# Altium footprint library texas.PCBLIB: 124 footprints (part 9 of 12) (continued)
## RFP_S-PQFP-G144-EXPAD [mm] (continued)
Top Paste:
  rectangle: -11.45,8.625 -9.95,8.875
  rectangle: -11.45,8.125 -9.95,8.375
  rectangle: -11.45,7.625 -9.95,7.875
  rectangle: -11.45,7.125 -9.95,7.375
  rectangle: -11.45,6.625 -9.95,6.875
  rectangle: -11.45,6.125 -9.95,6.375
  rectangle: -11.45,5.625 -9.95,5.875
  rectangle: -11.45,5.125 -9.95,5.375
  rectangle: -11.45,4.625 -9.95,4.875
  rectangle: -11.45,4.125 -9.95,4.375
  rectangle: -11.45,3.625 -9.95,3.875
  rectangle: -11.45,3.125 -9.95,3.375
  rectangle: -11.45,2.625 -9.95,2.875
  rectangle: -11.45,2.125 -9.95,2.375
  rectangle: -11.45,1.625 -9.95,1.875
  rectangle: -11.45,1.125 -9.95,1.375
  rectangle: -11.45,0.625 -9.95,0.875
  rectangle: -11.45,0.125 -9.95,0.375
  rectangle: -11.45,-0.375 -9.95,-0.125
  rectangle: -11.45,-0.875 -9.95,-0.625
  rectangle: -11.45,-1.375 -9.95,-1.125
  rectangle: -11.45,-1.875 -9.95,-1.625
  rectangle: -11.45,-2.375 -9.95,-2.125
  rectangle: -11.45,-2.875 -9.95,-2.625
  rectangle: -11.45,-3.375 -9.95,-3.125
  rectangle: -11.45,-3.875 -9.95,-3.625
  rectangle: -11.45,-4.375 -9.95,-4.125
  rectangle: -11.45,-4.875 -9.95,-4.625
  rectangle: -11.45,-5.375 -9.95,-5.125
  rectangle: -11.45,-5.875 -9.95,-5.625
  rectangle: -11.45,-6.375 -9.95,-6.125
  rectangle: -11.45,-6.875 -9.95,-6.625
  rectangle: -11.45,-7.375 -9.95,-7.125
  rectangle: -11.45,-7.875 -9.95,-7.625
  rectangle: -11.45,-8.375 -9.95,-8.125
  rectangle: -11.45,-8.875 -9.95,-8.625
  region: -8.625,-11.45 -8.625,-9.95 -8.875,-9.95 -8.875,-11.45
  region: -8.125,-11.45 -8.125,-9.95 -8.375,-9.95 -8.375,-11.45
  region: -7.625,-11.45 -7.625,-9.95 -7.875,-9.95 -7.875,-11.45
  region: -7.125,-11.45 -7.125,-9.95 -7.375,-9.95 -7.375,-11.45
  region: -6.625,-11.45 -6.625,-9.95 -6.875,-9.95 -6.875,-11.45
  region: -6.125,-11.45 -6.125,-9.95 -6.375,-9.95 -6.375,-11.45
  region: -5.625,-11.45 -5.625,-9.95 -5.875,-9.95 -5.875,-11.45
  region: -5.125,-11.45 -5.125,-9.95 -5.375,-9.95 -5.375,-11.45
  region: -4.625,-11.45 -4.625,-9.95 -4.875,-9.95 -4.875,-11.45
  region: -4.125,-11.45 -4.125,-9.95 -4.375,-9.95 -4.375,-11.45
  region: -3.625,-11.45 -3.625,-9.95 -3.875,-9.95 -3.875,-11.45
  region: -3.125,-11.45 -3.125,-9.95 -3.375,-9.95 -3.375,-11.45
  region: -2.625,-11.45 -2.625,-9.95 -2.875,-9.95 -2.875,-11.45
  region: -2.125,-11.45 -2.125,-9.95 -2.375,-9.95 -2.375,-11.45
  region: -1.625,-11.45 -1.625,-9.95 -1.875,-9.95 -1.875,-11.45
  region: -1.125,-11.45 -1.125,-9.95 -1.375,-9.95 -1.375,-11.45
  region: -0.625,-11.45 -0.625,-9.95 -0.875,-9.95 -0.875,-11.45
  region: -0.125,-11.45 -0.125,-9.95 -0.375,-9.95 -0.375,-11.45
  region: 0.375,-11.45 0.375,-9.95 0.125,-9.95 0.125,-11.45
  region: 0.875,-11.45 0.875,-9.95 0.625,-9.95 0.625,-11.45
  region: 1.375,-11.45 1.375,-9.95 1.125,-9.95 1.125,-11.45
  region: 1.875,-11.45 1.875,-9.95 1.625,-9.95 1.625,-11.45
  region: 2.375,-11.45 2.375,-9.95 2.125,-9.95 2.125,-11.45
  region: 2.875,-11.45 2.875,-9.95 2.625,-9.95 2.625,-11.45
  region: 3.375,-11.45 3.375,-9.95 3.125,-9.95 3.125,-11.45
  region: 3.875,-11.45 3.875,-9.95 3.625,-9.95 3.625,-11.45
  region: 4.375,-11.45 4.375,-9.95 4.125,-9.95 4.125,-11.45
  region: 4.875,-11.45 4.875,-9.95 4.625,-9.95 4.625,-11.45
  region: 5.375,-11.45 5.375,-9.95 5.125,-9.95 5.125,-11.45
  region: 5.875,-11.45 5.875,-9.95 5.625,-9.95 5.625,-11.45
  region: 6.375,-11.45 6.375,-9.95 6.125,-9.95 6.125,-11.45
  region: 6.875,-11.45 6.875,-9.95 6.625,-9.95 6.625,-11.45
  region: 7.375,-11.45 7.375,-9.95 7.125,-9.95 7.125,-11.45
  region: 7.875,-11.45 7.875,-9.95 7.625,-9.95 7.625,-11.45
  region: 8.375,-11.45 8.375,-9.95 8.125,-9.95 8.125,-11.45
  region: 8.875,-11.45 8.875,-9.95 8.625,-9.95 8.625,-11.45
  region: 11.45,-8.625 9.95,-8.625 9.95,-8.875 11.45,-8.875
  region: 11.45,-8.125 9.95,-8.125 9.95,-8.375 11.45,-8.375
  region: 11.45,-7.625 9.95,-7.625 9.95,-7.875 11.45,-7.875
  region: 11.45,-7.125 9.95,-7.125 9.95,-7.375 11.45,-7.375
  region: 11.45,-6.625 9.95,-6.625 9.95,-6.875 11.45,-6.875
  region: 11.45,-6.125 9.95,-6.125 9.95,-6.375 11.45,-6.375
  region: 11.45,-5.625 9.95,-5.625 9.95,-5.875 11.45,-5.875
  region: 11.45,-5.125 9.95,-5.125 9.95,-5.375 11.45,-5.375
  region: 11.45,-4.625 9.95,-4.625 9.95,-4.875 11.45,-4.875
  region: 11.45,-4.125 9.95,-4.125 9.95,-4.375 11.45,-4.375
  region: 11.45,-3.625 9.95,-3.625 9.95,-3.875 11.45,-3.875
  region: 11.45,-3.125 9.95,-3.125 9.95,-3.375 11.45,-3.375
  region: 11.45,-2.625 9.95,-2.625 9.95,-2.875 11.45,-2.875
  region: 11.45,-2.125 9.95,-2.125 9.95,-2.375 11.45,-2.375
  region: 11.45,-1.625 9.95,-1.625 9.95,-1.875 11.45,-1.875
  region: 11.45,-1.125 9.95,-1.125 9.95,-1.375 11.45,-1.375
  region: 11.45,-0.625 9.95,-0.625 9.95,-0.875 11.45,-0.875
  region: 11.45,-0.125 9.95,-0.125 9.95,-0.375 11.45,-0.375
  region: 11.45,0.375 9.95,0.375 9.95,0.125 11.45,0.125
  region: 11.45,0.875 9.95,0.875 9.95,0.625 11.45,0.625
  region: 11.45,1.375 9.95,1.375 9.95,1.125 11.45,1.125
  region: 11.45,1.875 9.95,1.875 9.95,1.625 11.45,1.625
  region: 11.45,2.375 9.95,2.375 9.95,2.125 11.45,2.125
  region: 11.45,2.875 9.95,2.875 9.95,2.625 11.45,2.625
  region: 11.45,3.375 9.95,3.375 9.95,3.125 11.45,3.125
  region: 11.45,3.875 9.95,3.875 9.95,3.625 11.45,3.625
  region: 11.45,4.375 9.95,4.375 9.95,4.125 11.45,4.125
  region: 11.45,4.875 9.95,4.875 9.95,4.625 11.45,4.625
  region: 11.45,5.375 9.95,5.375 9.95,5.125 11.45,5.125
  region: 11.45,5.875 9.95,5.875 9.95,5.625 11.45,5.625
  region: 11.45,6.375 9.95,6.375 9.95,6.125 11.45,6.125
  region: 11.45,6.875 9.95,6.875 9.95,6.625 11.45,6.625
  region: 11.45,7.375 9.95,7.375 9.95,7.125 11.45,7.125
  region: 11.45,7.875 9.95,7.875 9.95,7.625 11.45,7.625
  region: 11.45,8.375 9.95,8.375 9.95,8.125 11.45,8.125
  region: 11.45,8.875 9.95,8.875 9.95,8.625 11.45,8.625
  region: 8.625,11.45 8.625,9.95 8.875,9.95 8.875,11.45
  region: 8.125,11.45 8.125,9.95 8.375,9.95 8.375,11.45
  region: 7.625,11.45 7.625,9.95 7.875,9.95 7.875,11.45
  region: 7.125,11.45 7.125,9.95 7.375,9.95 7.375,11.45
  region: 6.625,11.45 6.625,9.95 6.875,9.95 6.875,11.45
  region: 6.125,11.45 6.125,9.95 6.375,9.95 6.375,11.45
  region: 5.625,11.45 5.625,9.95 5.875,9.95 5.875,11.45
  region: 5.125,11.45 5.125,9.95 5.375,9.95 5.375,11.45
  region: 4.625,11.45 4.625,9.95 4.875,9.95 4.875,11.45
  region: 4.125,11.45 4.125,9.95 4.375,9.95 4.375,11.45
  region: 3.625,11.45 3.625,9.95 3.875,9.95 3.875,11.45
  region: 3.125,11.45 3.125,9.95 3.375,9.95 3.375,11.45
  region: 2.625,11.45 2.625,9.95 2.875,9.95 2.875,11.45
  region: 2.125,11.45 2.125,9.95 2.375,9.95 2.375,11.45
  region: 1.625,11.45 1.625,9.95 1.875,9.95 1.875,11.45
  region: 1.125,11.45 1.125,9.95 1.375,9.95 1.375,11.45
  region: 0.625,11.45 0.625,9.95 0.875,9.95 0.875,11.45
  region: 0.125,11.45 0.125,9.95 0.375,9.95 0.375,11.45
  region: -0.375,11.45 -0.375,9.95 -0.125,9.95 -0.125,11.45
  region: -0.875,11.45 -0.875,9.95 -0.625,9.95 -0.625,11.45
  region: -1.375,11.45 -1.375,9.95 -1.125,9.95 -1.125,11.45
  region: -1.875,11.45 -1.875,9.95 -1.625,9.95 -1.625,11.45
  region: -2.375,11.45 -2.375,9.95 -2.125,9.95 -2.125,11.45
  region: -2.875,11.45 -2.875,9.95 -2.625,9.95 -2.625,11.45
  region: -3.375,11.45 -3.375,9.95 -3.125,9.95 -3.125,11.45
  region: -3.875,11.45 -3.875,9.95 -3.625,9.95 -3.625,11.45
  region: -4.375,11.45 -4.375,9.95 -4.125,9.95 -4.125,11.45
  region: -4.875,11.45 -4.875,9.95 -4.625,9.95 -4.625,11.45
  region: -5.375,11.45 -5.375,9.95 -5.125,9.95 -5.125,11.45
  region: -5.875,11.45 -5.875,9.95 -5.625,9.95 -5.625,11.45
  region: -6.375,11.45 -6.375,9.95 -6.125,9.95 -6.125,11.45
  region: -6.875,11.45 -6.875,9.95 -6.625,9.95 -6.625,11.45
  region: -7.375,11.45 -7.375,9.95 -7.125,9.95 -7.125,11.45
  region: -7.875,11.45 -7.875,9.95 -7.625,9.95 -7.625,11.45
  region: -8.375,11.45 -8.375,9.95 -8.125,9.95 -8.125,11.45
  region: -8.875,11.45 -8.875,9.95 -8.625,9.95 -8.625,11.45
  rectangle: -2.75,-2.75 2.75,2.775
Top Solder:
  rectangle: -11.55,8.575 -9.875,8.925
  rectangle: -11.55,8.075 -9.875,8.425
  rectangle: -11.55,7.575 -9.875,7.925
  rectangle: -11.55,7.075 -9.875,7.425
  rectangle: -11.55,6.575 -9.875,6.925
  rectangle: -11.55,6.075 -9.875,6.425
  rectangle: -11.55,5.575 -9.875,5.925
  rectangle: -11.55,5.075 -9.875,5.425
  rectangle: -11.55,4.575 -9.875,4.925
  rectangle: -11.55,4.075 -9.875,4.425
  rectangle: -11.55,3.575 -9.875,3.925
  rectangle: -11.55,3.075 -9.875,3.425
  rectangle: -11.55,2.575 -9.875,2.925
  rectangle: -11.55,2.075 -9.875,2.425
  rectangle: -11.55,1.575 -9.875,1.925
  rectangle: -11.55,1.075 -9.875,1.425
  rectangle: -11.55,0.575 -9.875,0.925
  rectangle: -11.55,0.075 -9.875,0.425
  rectangle: -11.55,-0.425 -9.875,-0.075
  rectangle: -11.55,-0.925 -9.875,-0.575
  rectangle: -11.55,-1.425 -9.875,-1.075
  rectangle: -11.55,-1.925 -9.875,-1.575
  rectangle: -11.55,-2.425 -9.875,-2.075
  rectangle: -11.55,-2.925 -9.875,-2.575
  rectangle: -11.55,-3.425 -9.875,-3.075
  rectangle: -11.55,-3.925 -9.875,-3.575
  rectangle: -11.55,-4.425 -9.875,-4.075
  rectangle: -11.55,-4.925 -9.875,-4.575
  rectangle: -11.55,-5.425 -9.875,-5.075
  rectangle: -11.55,-5.925 -9.875,-5.575
  rectangle: -11.55,-6.425 -9.875,-6.075
  rectangle: -11.55,-6.925 -9.875,-6.575
  rectangle: -11.55,-7.425 -9.875,-7.075
  rectangle: -11.55,-7.925 -9.875,-7.575
  rectangle: -11.55,-8.425 -9.875,-8.075
  rectangle: -11.55,-8.925 -9.875,-8.575
  region: -8.575,-11.55 -8.575,-9.875 -8.925,-9.875 -8.925,-11.55
  region: -8.075,-11.55 -8.075,-9.875 -8.425,-9.875 -8.425,-11.55
  region: -7.575,-11.55 -7.575,-9.875 -7.925,-9.875 -7.925,-11.55
  region: -7.075,-11.55 -7.075,-9.875 -7.425,-9.875 -7.425,-11.55
  region: -6.575,-11.55 -6.575,-9.875 -6.925,-9.875 -6.925,-11.55
  region: -6.075,-11.55 -6.075,-9.875 -6.425,-9.875 -6.425,-11.55
  region: -5.575,-11.55 -5.575,-9.875 -5.925,-9.875 -5.925,-11.55
  region: -5.075,-11.55 -5.075,-9.875 -5.425,-9.875 -5.425,-11.55
  region: -4.575,-11.55 -4.575,-9.875 -4.925,-9.875 -4.925,-11.55
  region: -4.075,-11.55 -4.075,-9.875 -4.425,-9.875 -4.425,-11.55
  region: -3.575,-11.55 -3.575,-9.875 -3.925,-9.875 -3.925,-11.55
  region: -3.075,-11.55 -3.075,-9.875 -3.425,-9.875 -3.425,-11.55
  region: -2.575,-11.55 -2.575,-9.875 -2.925,-9.875 -2.925,-11.55
  region: -2.075,-11.55 -2.075,-9.875 -2.425,-9.875 -2.425,-11.55
  region: -1.575,-11.55 -1.575,-9.875 -1.925,-9.875 -1.925,-11.55
  region: -1.075,-11.55 -1.075,-9.875 -1.425,-9.875 -1.425,-11.55
  region: -0.575,-11.55 -0.575,-9.875 -0.925,-9.875 -0.925,-11.55
  region: -0.075,-11.55 -0.075,-9.875 -0.425,-9.875 -0.425,-11.55
  region: 0.425,-11.55 0.425,-9.875 0.075,-9.875 0.075,-11.55
  region: 0.925,-11.55 0.925,-9.875 0.575,-9.875 0.575,-11.55
  region: 1.425,-11.55 1.425,-9.875 1.075,-9.875 1.075,-11.55
  region: 1.925,-11.55 1.925,-9.875 1.575,-9.875 1.575,-11.55
  region: 2.425,-11.55 2.425,-9.875 2.075,-9.875 2.075,-11.55
  region: 2.925,-11.55 2.925,-9.875 2.575,-9.875 2.575,-11.55
  region: 3.425,-11.55 3.425,-9.875 3.075,-9.875 3.075,-11.55
  region: 3.925,-11.55 3.925,-9.875 3.575,-9.875 3.575,-11.55
  region: 4.425,-11.55 4.425,-9.875 4.075,-9.875 4.075,-11.55
  region: 4.925,-11.55 4.925,-9.875 4.575,-9.875 4.575,-11.55
  region: 5.425,-11.55 5.425,-9.875 5.075,-9.875 5.075,-11.55
  region: 5.925,-11.55 5.925,-9.875 5.575,-9.875 5.575,-11.55
  region: 6.425,-11.55 6.425,-9.875 6.075,-9.875 6.075,-11.55
  region: 6.925,-11.55 6.925,-9.875 6.575,-9.875 6.575,-11.55
  region: 7.425,-11.55 7.425,-9.875 7.075,-9.875 7.075,-11.55
  region: 7.925,-11.55 7.925,-9.875 7.575,-9.875 7.575,-11.55
  region: 8.425,-11.55 8.425,-9.875 8.075,-9.875 8.075,-11.55
  region: 8.925,-11.55 8.925,-9.875 8.575,-9.875 8.575,-11.55
  region: 11.55,-8.575 9.875,-8.575 9.875,-8.925 11.55,-8.925
  region: 11.55,-8.075 9.875,-8.075 9.875,-8.425 11.55,-8.425
  region: 11.55,-7.575 9.875,-7.575 9.875,-7.925 11.55,-7.925
  region: 11.55,-7.075 9.875,-7.075 9.875,-7.425 11.55,-7.425
  region: 11.55,-6.575 9.875,-6.575 9.875,-6.925 11.55,-6.925
  region: 11.55,-6.075 9.875,-6.075 9.875,-6.425 11.55,-6.425
  region: 11.55,-5.575 9.875,-5.575 9.875,-5.925 11.55,-5.925
  region: 11.55,-5.075 9.875,-5.075 9.875,-5.425 11.55,-5.425
  region: 11.55,-4.575 9.875,-4.575 9.875,-4.925 11.55,-4.925
  region: 11.55,-4.075 9.875,-4.075 9.875,-4.425 11.55,-4.425
  region: 11.55,-3.575 9.875,-3.575 9.875,-3.925 11.55,-3.925
  region: 11.55,-3.075 9.875,-3.075 9.875,-3.425 11.55,-3.425
  region: 11.55,-2.575 9.875,-2.575 9.875,-2.925 11.55,-2.925
  region: 11.55,-2.075 9.875,-2.075 9.875,-2.425 11.55,-2.425
  region: 11.55,-1.575 9.875,-1.575 9.875,-1.925 11.55,-1.925
  region: 11.55,-1.075 9.875,-1.075 9.875,-1.425 11.55,-1.425
  region: 11.55,-0.575 9.875,-0.575 9.875,-0.925 11.55,-0.925
  region: 11.55,-0.075 9.875,-0.075 9.875,-0.425 11.55,-0.425
  region: 11.55,0.425 9.875,0.425 9.875,0.075 11.55,0.075
  region: 11.55,0.925 9.875,0.925 9.875,0.575 11.55,0.575
  region: 11.55,1.425 9.875,1.425 9.875,1.075 11.55,1.075
  region: 11.55,1.925 9.875,1.925 9.875,1.575 11.55,1.575
  region: 11.55,2.425 9.875,2.425 9.875,2.075 11.55,2.075
  region: 11.55,2.925 9.875,2.925 9.875,2.575 11.55,2.575
  region: 11.55,3.425 9.875,3.425 9.875,3.075 11.55,3.075
  region: 11.55,3.925 9.875,3.925 9.875,3.575 11.55,3.575
  region: 11.55,4.425 9.875,4.425 9.875,4.075 11.55,4.075
  region: 11.55,4.925 9.875,4.925 9.875,4.575 11.55,4.575
  region: 11.55,5.425 9.875,5.425 9.875,5.075 11.55,5.075
  region: 11.55,5.925 9.875,5.925 9.875,5.575 11.55,5.575
  region: 11.55,6.425 9.875,6.425 9.875,6.075 11.55,6.075
  region: 11.55,6.925 9.875,6.925 9.875,6.575 11.55,6.575
  region: 11.55,7.425 9.875,7.425 9.875,7.075 11.55,7.075
  region: 11.55,7.925 9.875,7.925 9.875,7.575 11.55,7.575
  region: 11.55,8.425 9.875,8.425 9.875,8.075 11.55,8.075
  region: 11.55,8.925 9.875,8.925 9.875,8.575 11.55,8.575
  region: 8.575,11.55 8.575,9.875 8.925,9.875 8.925,11.55
  region: 8.075,11.55 8.075,9.875 8.425,9.875 8.425,11.55
  region: 7.575,11.55 7.575,9.875 7.925,9.875 7.925,11.55
  region: 7.075,11.55 7.075,9.875 7.425,9.875 7.425,11.55
  region: 6.575,11.55 6.575,9.875 6.925,9.875 6.925,11.55
  region: 6.075,11.55 6.075,9.875 6.425,9.875 6.425,11.55
  region: 5.575,11.55 5.575,9.875 5.925,9.875 5.925,11.55
  region: 5.075,11.55 5.075,9.875 5.425,9.875 5.425,11.55
  region: 4.575,11.55 4.575,9.875 4.925,9.875 4.925,11.55
  region: 4.075,11.55 4.075,9.875 4.425,9.875 4.425,11.55
  region: 3.575,11.55 3.575,9.875 3.925,9.875 3.925,11.55
  region: 3.075,11.55 3.075,9.875 3.425,9.875 3.425,11.55
  region: 2.575,11.55 2.575,9.875 2.925,9.875 2.925,11.55
  region: 2.075,11.55 2.075,9.875 2.425,9.875 2.425,11.55
  region: 1.575,11.55 1.575,9.875 1.925,9.875 1.925,11.55
  region: 1.075,11.55 1.075,9.875 1.425,9.875 1.425,11.55
  region: 0.575,11.55 0.575,9.875 0.925,9.875 0.925,11.55
  region: 0.075,11.55 0.075,9.875 0.425,9.875 0.425,11.55
  region: -0.425,11.55 -0.425,9.875 -0.075,9.875 -0.075,11.55
  region: -0.925,11.55 -0.925,9.875 -0.575,9.875 -0.575,11.55
  region: -1.425,11.55 -1.425,9.875 -1.075,9.875 -1.075,11.55
  region: -1.925,11.55 -1.925,9.875 -1.575,9.875 -1.575,11.55
  region: -2.425,11.55 -2.425,9.875 -2.075,9.875 -2.075,11.55
  region: -2.925,11.55 -2.925,9.875 -2.575,9.875 -2.575,11.55
  region: -3.425,11.55 -3.425,9.875 -3.075,9.875 -3.075,11.55
  region: -3.925,11.55 -3.925,9.875 -3.575,9.875 -3.575,11.55
  region: -4.425,11.55 -4.425,9.875 -4.075,9.875 -4.075,11.55
  region: -4.925,11.55 -4.925,9.875 -4.575,9.875 -4.575,11.55
  region: -5.425,11.55 -5.425,9.875 -5.075,9.875 -5.075,11.55
  region: -5.925,11.55 -5.925,9.875 -5.575,9.875 -5.575,11.55
  region: -6.425,11.55 -6.425,9.875 -6.075,9.875 -6.075,11.55
  region: -6.925,11.55 -6.925,9.875 -6.575,9.875 -6.575,11.55
  region: -7.425,11.55 -7.425,9.875 -7.075,9.875 -7.075,11.55
  region: -7.925,11.55 -7.925,9.875 -7.575,9.875 -7.575,11.55
  region: -8.425,11.55 -8.425,9.875 -8.075,9.875 -8.075,11.55
  region: -8.925,11.55 -8.925,9.875 -8.575,9.875 -8.575,11.55
  rectangle: -2.9,-2.9 2.9,2.9
Mechanical 2:
  lines w0.203: -9.998,9.3 -9.3,9.998
Mechanical 18:
  drawing of 220 lines, arcs and shapes, not listed

## RGC_S-PVQFV-N64 [mm]
pads (65):
  rrect75% 0.85x0.28 smd paste-0.425 mask-0.425: 1(-4.475,3.75) 2(-4.475,3.25) 3(-4.475,2.75) 4(-4.475,2.25) 5(-4.475,1.75) 6(-4.475,1.25) 7(-4.475,0.75) 8(-4.475,0.25) 9(-4.475,-0.25) 10(-4.475,-0.75) 11(-4.475,-1.25) 12(-4.475,-1.75) 13(-4.475,-2.25) 14(-4.475,-2.75) 15(-4.475,-3.25) 16(-4.475,-3.75) 33(4.475,-3.75) 34(4.475,-3.25) 35(4.475,-2.75) 36(4.475,-2.25) 37(4.475,-1.75) 38(4.475,-1.25) 39(4.475,-0.75) 40(4.475,-0.25) 41(4.475,0.25) 42(4.475,0.75) 43(4.475,1.25) 44(4.475,1.75) 45(4.475,2.25) 46(4.475,2.75) 47(4.475,3.25) 48(4.475,3.75)
  rrect75% 0.28x0.85 smd paste-0.425 mask-0.425: 17(-3.75,-4.475) 18(-3.25,-4.475) 19(-2.75,-4.475) 20(-2.25,-4.475) 21(-1.75,-4.475) 22(-1.25,-4.475) 23(-0.75,-4.475) 24(-0.25,-4.475) 25(0.25,-4.475) 26(0.75,-4.475) 27(1.25,-4.475) 28(1.75,-4.475) 29(2.25,-4.475) 30(2.75,-4.475) 31(3.25,-4.475) 32(3.75,-4.475) 49(3.75,4.475) 50(3.25,4.475) 51(2.75,4.475) 52(2.25,4.475) 53(1.75,4.475) 54(1.25,4.475) 55(0.75,4.475) 56(0.25,4.475) 57(-0.25,4.475) 58(-0.75,4.475) 59(-1.25,4.475) 60(-1.75,4.475) 61(-2.25,4.475) 62(-2.75,4.475) 63(-3.25,4.475) 64(-3.75,4.475)
  rect 4.25x4.25 smd paste-2.125: EXP(0,0)
Top Paste:
  circle w0: c-4.2,3.75 r0.125
  circle w0: c-4.2,3.25 r0.125
  circle w0: c-4.2,2.75 r0.125
  circle w0: c-4.2,2.25 r0.125
  circle w0: c-4.2,1.75 r0.125
  circle w0: c-4.2,1.25 r0.125
  circle w0: c-4.2,0.75 r0.125
  circle w0: c-4.2,0.25 r0.125
  circle w0: c-4.2,-0.25 r0.125
  circle w0: c-4.2,-0.75 r0.125
  circle w0: c-4.2,-1.25 r0.125
  circle w0: c-4.2,-1.75 r0.125
  circle w0: c-4.2,-2.25 r0.125
  circle w0: c-4.2,-2.75 r0.125
  circle w0: c-4.2,-3.25 r0.125
  circle w0: c-4.2,-3.75 r0.125
  circle w0: c-3.75,-4.2 r0.125
  circle w0: c-3.25,-4.2 r0.125
  circle w0: c-2.75,-4.2 r0.125
  circle w0: c-2.25,-4.2 r0.125
  circle w0: c-1.75,-4.2 r0.125
  circle w0: c-1.25,-4.2 r0.125
  circle w0: c-0.75,-4.2 r0.125
  circle w0: c-0.25,-4.2 r0.125
  circle w0: c0.25,-4.2 r0.125
  circle w0: c0.75,-4.2 r0.125
  circle w0: c1.25,-4.2 r0.125
  circle w0: c1.75,-4.2 r0.125
  circle w0: c2.25,-4.2 r0.125
  circle w0: c2.75,-4.2 r0.125
  circle w0: c3.25,-4.2 r0.125
  circle w0: c3.75,-4.2 r0.125
  circle w0: c4.2,-3.75 r0.125
  circle w0: c4.2,-3.25 r0.125
  circle w0: c4.2,-2.75 r0.125
  circle w0: c4.2,-2.25 r0.125
  circle w0: c4.2,-1.75 r0.125
  circle w0: c4.2,-1.25 r0.125
  circle w0: c4.2,-0.75 r0.125
  circle w0: c4.2,-0.25 r0.125
  circle w0: c4.2,0.25 r0.125
  circle w0: c4.2,0.75 r0.125
  circle w0: c4.2,1.25 r0.125
  circle w0: c4.2,1.75 r0.125
  circle w0: c4.2,2.25 r0.125
  circle w0: c4.2,2.75 r0.125
  circle w0: c4.2,3.25 r0.125
  circle w0: c4.2,3.75 r0.125
  circle w0: c3.75,4.2 r0.125
  circle w0: c3.25,4.2 r0.125
  circle w0: c2.75,4.2 r0.125
  circle w0: c2.25,4.2 r0.125
  circle w0: c1.75,4.2 r0.125
  circle w0: c1.25,4.2 r0.125
  circle w0: c0.75,4.2 r0.125
  circle w0: c0.25,4.2 r0.125
  circle w0: c-0.25,4.2 r0.125
  circle w0: c-0.75,4.2 r0.125
  circle w0: c-1.25,4.2 r0.125
  circle w0: c-1.75,4.2 r0.125
  circle w0: c-2.25,4.2 r0.125
  circle w0: c-2.75,4.2 r0.125
  circle w0: c-3.25,4.2 r0.125
  circle w0: c-3.75,4.2 r0.125
  rectangle: -4.825,3.625 -4.2,3.875
  rectangle: -4.825,3.125 -4.2,3.375
  rectangle: -4.825,2.625 -4.2,2.875
  rectangle: -4.825,2.125 -4.2,2.375
  rectangle: -4.825,1.625 -4.2,1.875
  rectangle: -4.825,1.125 -4.2,1.375
  rectangle: -4.825,0.625 -4.2,0.875
  rectangle: -4.825,0.125 -4.2,0.375
  rectangle: -4.825,-0.375 -4.2,-0.125
  rectangle: -4.825,-0.875 -4.2,-0.625
  rectangle: -4.825,-1.375 -4.2,-1.125
  rectangle: -4.825,-1.875 -4.2,-1.625
  rectangle: -4.825,-2.375 -4.2,-2.125
  rectangle: -4.825,-2.875 -4.2,-2.625
  rectangle: -4.825,-3.375 -4.2,-3.125
  rectangle: -4.825,-3.875 -4.2,-3.625
  region: -3.625,-4.825 -3.625,-4.2 -3.875,-4.2 -3.875,-4.825
  region: -3.125,-4.825 -3.125,-4.2 -3.375,-4.2 -3.375,-4.825
  region: -2.625,-4.825 -2.625,-4.2 -2.875,-4.2 -2.875,-4.825
  region: -2.125,-4.825 -2.125,-4.2 -2.375,-4.2 -2.375,-4.825
  region: -1.625,-4.825 -1.625,-4.2 -1.875,-4.2 -1.875,-4.825
  region: -1.125,-4.825 -1.125,-4.2 -1.375,-4.2 -1.375,-4.825
  region: -0.625,-4.825 -0.625,-4.2 -0.875,-4.2 -0.875,-4.825
  region: -0.125,-4.825 -0.125,-4.2 -0.375,-4.2 -0.375,-4.825
  region: 0.375,-4.825 0.375,-4.2 0.125,-4.2 0.125,-4.825
  region: 0.875,-4.825 0.875,-4.2 0.625,-4.2 0.625,-4.825
  region: 1.375,-4.825 1.375,-4.2 1.125,-4.2 1.125,-4.825
  region: 1.875,-4.825 1.875,-4.2 1.625,-4.2 1.625,-4.825
  region: 2.375,-4.825 2.375,-4.2 2.125,-4.2 2.125,-4.825
  region: 2.875,-4.825 2.875,-4.2 2.625,-4.2 2.625,-4.825
  region: 3.375,-4.825 3.375,-4.2 3.125,-4.2 3.125,-4.825
  region: 3.875,-4.825 3.875,-4.2 3.625,-4.2 3.625,-4.825
  region: 4.825,-3.625 4.2,-3.625 4.2,-3.875 4.825,-3.875
  region: 4.825,-3.125 4.2,-3.125 4.2,-3.375 4.825,-3.375
  region: 4.825,-2.625 4.2,-2.625 4.2,-2.875 4.825,-2.875
  region: 4.825,-2.125 4.2,-2.125 4.2,-2.375 4.825,-2.375
  region: 4.825,-1.625 4.2,-1.625 4.2,-1.875 4.825,-1.875
  region: 4.825,-1.125 4.2,-1.125 4.2,-1.375 4.825,-1.375
  region: 4.825,-0.625 4.2,-0.625 4.2,-0.875 4.825,-0.875
  region: 4.825,-0.125 4.2,-0.125 4.2,-0.375 4.825,-0.375
  region: 4.825,0.375 4.2,0.375 4.2,0.125 4.825,0.125
  region: 4.825,0.875 4.2,0.875 4.2,0.625 4.825,0.625
  region: 4.825,1.375 4.2,1.375 4.2,1.125 4.825,1.125
  region: 4.825,1.875 4.2,1.875 4.2,1.625 4.825,1.625
  region: 4.825,2.375 4.2,2.375 4.2,2.125 4.825,2.125
  region: 4.825,2.875 4.2,2.875 4.2,2.625 4.825,2.625
  region: 4.825,3.375 4.2,3.375 4.2,3.125 4.825,3.125
  region: 4.825,3.875 4.2,3.875 4.2,3.625 4.825,3.625
  region: 3.625,4.825 3.625,4.2 3.875,4.2 3.875,4.825
  region: 3.125,4.825 3.125,4.2 3.375,4.2 3.375,4.825
  region: 2.625,4.825 2.625,4.2 2.875,4.2 2.875,4.825
  region: 2.125,4.825 2.125,4.2 2.375,4.2 2.375,4.825
  region: 1.625,4.825 1.625,4.2 1.875,4.2 1.875,4.825
  region: 1.125,4.825 1.125,4.2 1.375,4.2 1.375,4.825
  region: 0.625,4.825 0.625,4.2 0.875,4.2 0.875,4.825
  region: 0.125,4.825 0.125,4.2 0.375,4.2 0.375,4.825
  region: -0.375,4.825 -0.375,4.2 -0.125,4.2 -0.125,4.825
  region: -0.875,4.825 -0.875,4.2 -0.625,4.2 -0.625,4.825
  region: -1.375,4.825 -1.375,4.2 -1.125,4.2 -1.125,4.825
  region: -1.875,4.825 -1.875,4.2 -1.625,4.2 -1.625,4.825
  region: -2.375,4.825 -2.375,4.2 -2.125,4.2 -2.125,4.825
  region: -2.875,4.825 -2.875,4.2 -2.625,4.2 -2.625,4.825
  region: -3.375,4.825 -3.375,4.2 -3.125,4.2 -3.125,4.825
  region: -3.875,4.825 -3.875,4.2 -3.625,4.2 -3.625,4.825
  region: -0.15,0.15 -0.15,1.95 -1.95,1.95 -1.95,0.15
  region: -0.15,-0.15 -1.95,-0.15 -1.95,-1.95 -0.15,-1.95
  region: 0.15,-0.15 0.15,-1.95 1.95,-1.95 1.95,-0.15
  rectangle: 0.15,0.15 1.95,1.95
Top Solder:
  drawing of 64 lines, arcs and shapes, not listed
Mechanical 2:
  lines w0.203: -4.475,-4.275 -4.475,-4.475 -4.275,-4.475 ; -4.475,4.275 -4.475,4.475 -4.275,4.475 ; 4.275,-4.475 4.475,-4.475 4.475,-4.275 ; 4.275,4.475 4.475,4.475 4.475,4.275
Mechanical 18:
  rectangle: -4.5,0 0,4.5
  lines w0.203: -4.475,-4.475 4.475,-4.475 4.475,4.475 -4.475,4.475 -4.475,-4.475